# Altium footprint library PCBLIB.PcbLib: 775 footprints (part 44 of 49)
Each footprint in its own frame and in the unit in brackets; x right, y up, seen from the top. Pads: shape width x height; smd on the part's side, far side on the other; paste and mask are expansions set on the pad; w line width, h text height; cw(c..) or ccw(c..) is an arc to the next point about the centre after c.
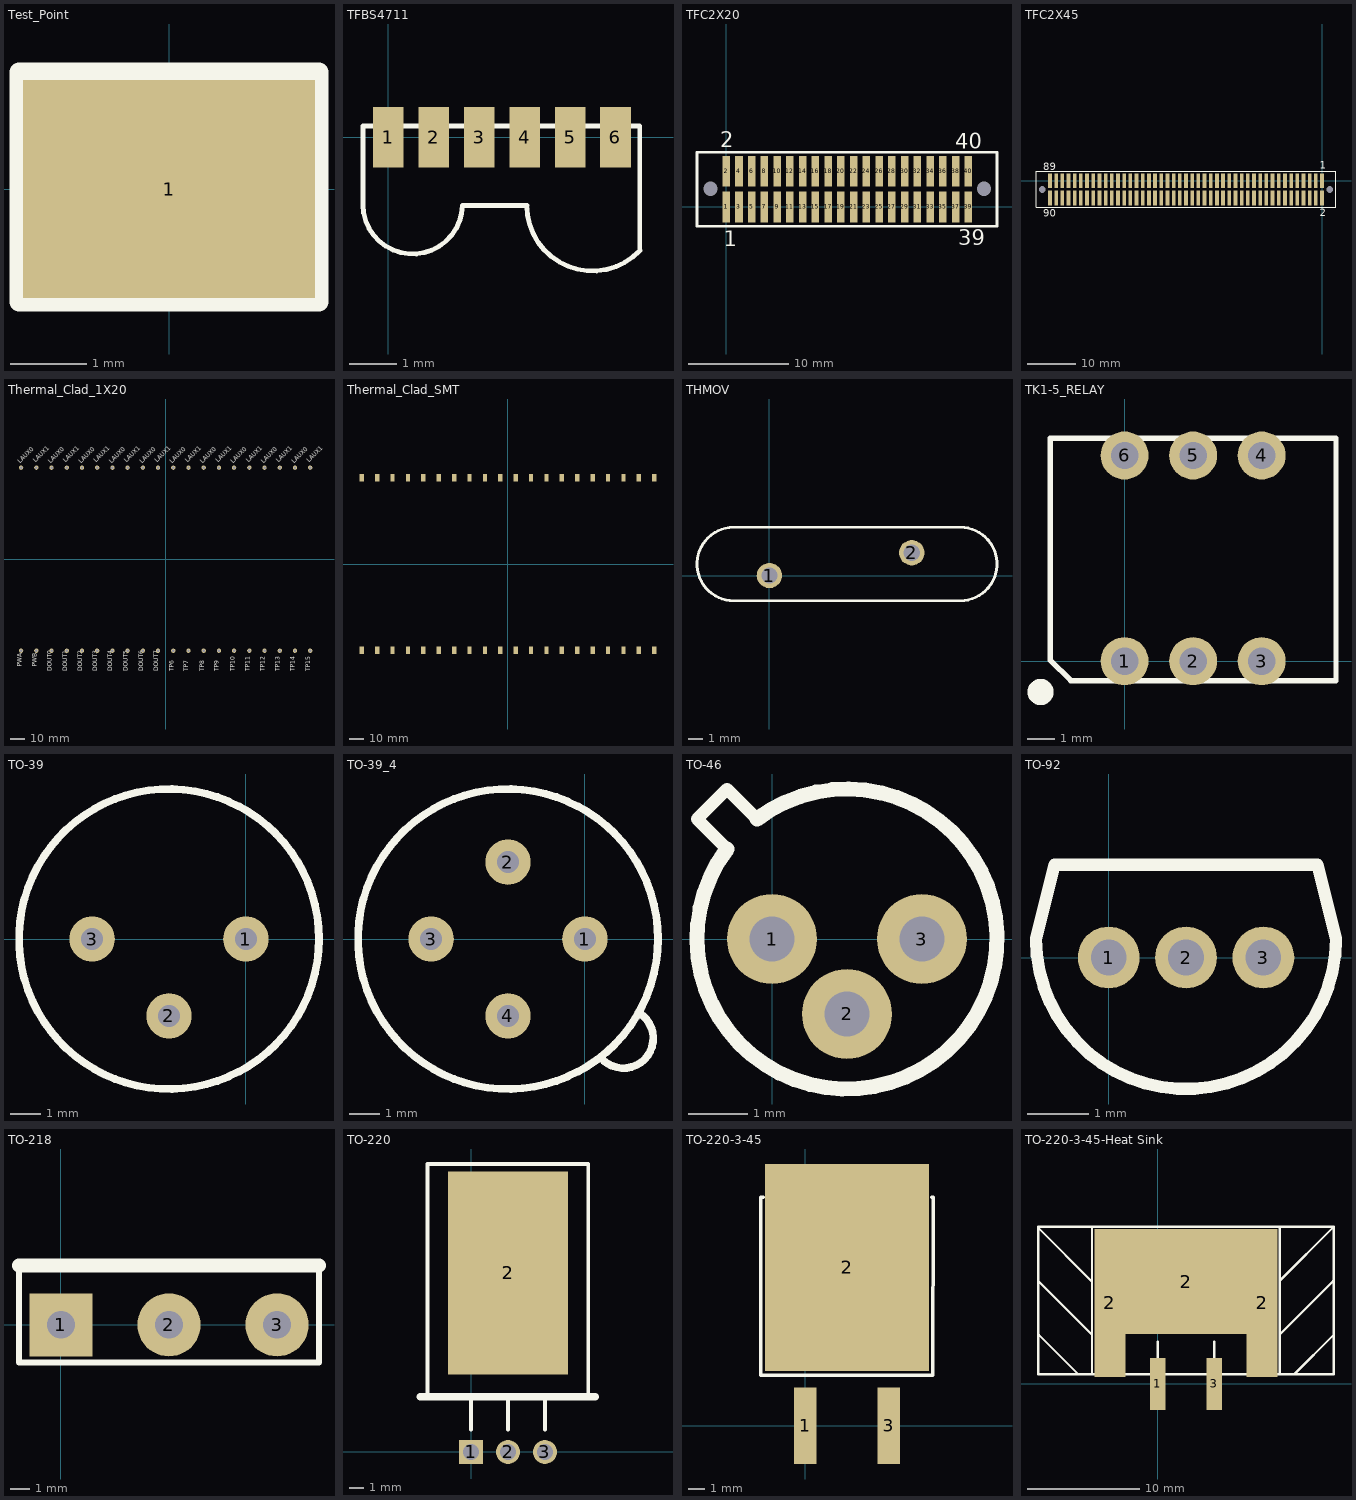
[diagram p43: the footprints below, top view; thin cyan lines are the x and y axes]

## Test_Point [mil]
height 4330.71
pads (1):
  rect 150x112 smd: 1(0,0)
TopOverlay:
  lines w10: -77,-58 -77,60 77,60 77,-58 -77,-58

## TFBS4711 [mm]
pads (6):
  rect 0.64x1.27 smd: 1(0,0) 2(0.95,0) 3(1.9,0) 4(2.85,0) 5(3.8,0) 6(4.75,0)
TopOverlay:
  lines w0.102: 5.258,-2.362 5.258,0.235 -0.533,0.235 -0.533,-1.415 ccw(c0.508,-1.397) 1.549,-1.422 2.896,-1.422 ccw(c4.267,-1.422) 5.262,-2.366

## TFC2X20 [mil]
pads (42):
  rect 30x120 smd: 1(0,0) 2(0,140) 3(50,0) 4(50,140) 5(100,0) 6(100,140) 7(150,0) 8(150,140) 9(200,0) 10(200,140) 11(250,0) 12(250,140) 13(300,0) 14(300,140) 15(350,0) 16(350,140) 17(400,0) 18(400,140) 19(450,0) 20(450,140) 21(500,0) 22(500,140) 23(550,0) 24(550,140) 25(600,0) 26(600,140) 27(650,0) 28(650,140) 29(700,0) 30(700,140) 31(750,0) 32(750,140) 33(800,0) 34(800,140) 35(850,0) 36(850,140) 37(900,0) 38(900,140) 39(950,0) 40(950,140)
  round 0 hole 56 unplated: SP(-61.5,71) SP(1011.5,71)
TopOverlay:
  lines w10: -114.5,215 -114.5,-76 1062.5,-76 1062.5,215 -114,215
  text "39" at 910.5,-150 h60
  text "40" at 899.5,228 h60
  text "2" at -23.5,235 h60
  text "1" at -9.5,-154 h60

## TFC2X45 [mil]
height 133
pads (92):
  rect 30x120 smd: 1(0,0) 2(0,-140) 3(-50,0) 4(-50,-140) 5(-100,0) 6(-100,-140) 7(-150,0) 8(-150,-140) 9(-200,0) 10(-200,-140) 11(-250,0) 12(-250,-140) 13(-300,0) 14(-300,-140) 15(-350,0) 16(-350,-140) 17(-400,0) 18(-400,-140) 19(-450,0) 20(-450,-140) 21(-500,0) 22(-500,-140) 23(-550,0) 24(-550,-140) 25(-600,0) 26(-600,-140) 27(-650,0) 28(-650,-140) 29(-700,0) 30(-700,-140) 31(-750,0) 32(-750,-140) 33(-800,0) 34(-800,-140) 35(-850,0) 36(-850,-140) 37(-900,0) 38(-900,-140) 39(-950,0) 40(-950,-140) 41(-1000,0) 42(-1000,-140) 43(-1050,0) 44(-1050,-140) 45(-1100,0) 46(-1100,-140) 47(-1150,0) 48(-1150,-140) 49(-1200,0) 50(-1200,-140) 51(-1250,0) 52(-1250,-140) 53(-1300,0) 54(-1300,-140) 55(-1350,0) 56(-1350,-140) 57(-1400,0) 58(-1400,-140) 59(-1450,0) 60(-1450,-140) 61(-1500,0) 62(-1500,-140) 63(-1550,0) 64(-1550,-140) 65(-1600,0) 66(-1600,-140) 67(-1650,0) 68(-1650,-140) 69(-1700,0) 70(-1700,-140) 71(-1750,0) 72(-1750,-140) 73(-1800,0) 74(-1800,-140) 75(-1850,0) 76(-1850,-140) 77(-1900,0) 78(-1900,-140) 79(-1950,0) 80(-1950,-140) 81(-2000,0) 82(-2000,-140) 83(-2050,0) 84(-2050,-140) 85(-2100,0) 86(-2100,-140) 87(-2150,0) 88(-2150,-140) 89(-2200,0) 90(-2200,-140)
  round 0 hole 56 unplated: SP(-2262.5,-70) SP(62.5,-70)
TopOverlay:
  lines w10: -2313,-215 113,-215 113,75 -2313,75 -2313,-215
  text "1" at -16.5,96 h60
  text "2" at -19.5,-288 h60
  text "90" at -2253.5,-290 h60
  text "89" at -2255.5,86 h60

## Thermal_Clad_1X20 [mil]
pads (40):
  round 115 hole 65: 1(-3900,-2470) 2(-3489.47,-2470) 3(-3078.95,-2470) 4(-2668.42,-2470) 5(-2257.89,-2470) 6(-1847.37,-2470) 7(-1436.84,-2470) 8(-1026.32,-2470) 9(-615.79,-2470) 10(-205.26,-2470) 11(205.26,-2470) 12(615.79,-2470) 13(1026.32,-2470) 14(1436.84,-2470) 15(1847.37,-2470) 16(2257.89,-2470) 17(2668.42,-2470) 18(3078.95,-2470) 19(3489.47,-2470) 20(3900,-2470) 21(3900,2470) 22(3489.47,2470) 23(3078.95,2470) 24(2668.42,2470) 25(2257.89,2470) 26(1847.37,2470) 27(1436.84,2470) 28(1026.32,2470) 29(615.79,2470) 30(205.26,2470) 31(-205.26,2470) 32(-615.79,2470) 33(-1026.32,2470) 34(-1436.84,2470) 35(-1847.37,2470) 36(-2257.89,2470) 37(-2668.42,2470) 38(-3078.95,2470) 39(-3489.47,2470) 40(-3900,2470)
TopOverlay:
  text "TP15" at 3937.65,-3029.83 h200
  text "TP14" at 3528.54,-3029.83 h200
  text "TP13" at 3115.27,-3029.83 h200
  text "TP12" at 2720.65,-3029.83 h200
  text "TP11" at 2310.12,-3029.83 h200
  text "TP10" at 1898.01,-3029.83 h200
  text "TP9" at 1472.91,-3029.83 h200
  text "TP8" at 1080.04,-3029.83 h200
  text "TP7" at 654.86,-3029.83 h200
  text "TP6" at 257.41,-3029.83 h200
  text "DOUT7" at -165.2,-3030 h200
  text "DOUT6" at -563.64,-3030 h200
  text "DOUT5" at -987.66,-3030 h200
  text "DOUT4" at -1396.77,-3030 h200
  text "DOUT3" at -1810.05,-3030 h200
  text "DOUT2" at -2206.08,-3030 h200
  text "DOUT1" at -2616.61,-3030 h200
  text "DOUT0" at -3027.3,-3030 h200
  text "PWB" at -3437.41,-2900 h200
  text "PWA" at -3847.77,-2900 h200
  text "LAUX0" at 2673.82,2550.84 h200
  text "LAUX0" at 3494.87,2550.84 h200
  text "LAUX1" at 3084.59,2570 h200
  text "LAUX1" at 3905.65,2570 h200
  text "LAUX1" at 2263.54,2570 h200
  text "LAUX1" at 1442.49,2570 h200
  text "LAUX1" at 621.44,2570 h200
  text "LAUX1" at -199.62,2570 h200
  text "LAUX1" at -1020.67,2570 h200
  text "LAUX1" at -1841.72,2570 h200
  text "LAUX1" at -2662.77,2570 h200
  text "LAUX1" at -3483.83,2570 h200
  text "LAUX0" at 1852.76,2550.84 h200
  text "LAUX0" at 1031.71,2550.84 h200
  text "LAUX0" at 205,2550.84 h200
  text "LAUX0" at -610.39,2550.84 h200
  text "LAUX0" at -1431.45,2550.84 h200
  text "LAUX0" at -2252.5,2550.84 h200
  text "LAUX0" at -3073.55,2550.84 h200
  text "LAUX0" at -3894.6,2550.84 h200

## Thermal_Clad_SMT [mil]
pads (40):
  rect 115x200 smd: 1(-3900,-2295) 2(-3489.47,-2295) 3(-3078.95,-2295) 4(-2668.42,-2295) 5(-2257.89,-2295) 6(-1847.37,-2295) 7(-1436.84,-2295) 8(-1026.32,-2295) 9(-615.79,-2295) 10(-205.26,-2295) 11(205.26,-2295) 12(615.79,-2295) 13(1026.32,-2295) 14(1436.84,-2295) 15(1847.37,-2295) 16(2257.89,-2295) 17(2668.42,-2295) 18(3078.95,-2295) 19(3489.47,-2295) 20(3900,-2295) 21(3900,2295) 22(3489.47,2295) 23(3078.95,2295) 24(2668.42,2295) 25(2257.89,2295) 26(1847.37,2295) 27(1436.84,2295) 28(1026.32,2295) 29(615.79,2295) 30(205.26,2295) 31(-205.26,2295) 32(-615.79,2295) 33(-1026.32,2295) 34(-1436.84,2295) 35(-1847.37,2295) 36(-2257.89,2295) 37(-2668.42,2295) 38(-3078.95,2295) 39(-3489.47,2295) 40(-3900,2295)

## THMOV [mil]
height 1082.68
pads (2):
  round 70 hole 45: 1(0,0) 2(393.7,62.99)
TopOverlay:
  lines w8: -98.54,-69.61 cw(c-98.68,31.89) -99.33,133.38 528.26,133.38 cw(c527.92,31.88) 528.25,-69.62 ; -97.61,-69.61 529.98,-69.61

## TK1-5_RELAY [mil]
height 157
pads (6):
  round 70 hole 40: 1(0,0) 2(100,0) 3(200,0) 4(200,300) 5(100,300) 6(0,300)
TopOverlay:
  circle w25: c-122.57,-45.07 r6.62
  lines w8: -108.5,1.56 -78.4,-28.54 308.5,-28.54 308.5,325.46 -108.5,325.46 -108.5,1.56

## TO-39 [mil]
pads (3):
  round 59 hole 29: 1(0,0) 2(-100,-100) 3(-200,0)
TopOverlay:
  circle w10: c-100,0 r195

## TO-39_4 [mil]
pads (4):
  round 59 hole 29: 1(0,0) 2(-100,100) 3(-200,0) 4(-100,-100)
TopOverlay:
  circle w10: c-100,0 r195
  lines w10: 24.33,-158.13 ccw(c50.06,-129.12) 69.65,-95.67

## TO-46 [mil]
pads (3):
  round 60 hole 30: 1(0,0) 2(50,-50) 3(100,0)
TopOverlay:
  lines w8: -30,60 -50,80 -30,100 -10,80
  lines w10: -30,60 ccw(c50,0) -10,80
Mechanical4:
  text ".110" at 0,0.36 h1
  text ".100" at 0,0 h1

## TO-92 [mil]
height 225
pads (3):
  round 40 hole 23: 1(0,0) 2(50,0) 3(100,0)
TopOverlay:
  lines w8: -47,12 ccw(c49.99,11.98) 146.98,11.98 135,60 -35,60 -47,12

## TO-218 [mm]
pads (3):
  rect 3.2x3.2 hole 1.4: 1(0,0)
  round 3.2 hole 1.4: 2(5.475,0) 3(10.95,0)
TopOverlay:
  lines w0.3: -2.125,3 -2.125,-1.9 13.075,-1.9 13.075,3
  lines w0.7: -2.125,3 13.075,3

## TO-220 [mil]
pads (4):
  rect 65x65 hole 43: 1(0,0)
  round 65 hole 43: 2(100,0) 3(200,0)
  rect 325x550 smd: 2(100,485)
TopOverlay:
  lines w10: -118,150 -118,780 317,780 317,150 ; 0,60 0,150 ; 100,60 100,150 ; 200,60 200,150
  lines w20: -138,150 337,150
Mechanical4:
  text ".100" at 0,0 h1

## TO-220-3-45 [mil]
pads (3):
  rect 54x182 smd: 1(0,0) 3(198,0)
  rect 389.76x492.13 smd: 2(99,376.43)
TopOverlay:
  lines w8: -100,543.76 -105.88,543.76 -105.88,120 303.3,120.38 303.88,543.76 300,543.76
Mechanical4:
  text ".075" at -1,60 h1

## TO-220-3-45-Heat Sink [mil]
pads (5):
  rect 54x182 smd: 1(0,0) 3(198,0)
  rect 110x520 smd: 2(-168.58,285) 2(366.44,285)
  rect 445x370 smd: 2(99,360)
TopOverlay:
  lines w8: -419.3,547.37 -232.25,360.32 ; -419.22,360.32 -231.93,173.03 ; -418.82,173.03 -279.67,33.88 ; -232.01,34.74 -232.01,552.96 ; 0,82.86 0,147.85 ; 198,82.86 198,147.85 ; 428.22,34.74 428.22,552.96 ; 428.36,173.45 617.22,362.32 ; 429.13,363.6 618.5,552.96 ; 480.09,34.53 618.5,172.95 ; 618.5,552.96 -420.5,552.96 -420.5,33.46 618.5,33.46 618.5,552.96
Mechanical4:
  text ".075" at -1,41.85 h1